# Altium footprint library Binh.PcbLib: 863 footprints (part 12 of 54)
Each footprint in its own frame and in the unit in brackets; x right, y up, seen from the top. Pads: shape width x height; smd on the part's side, far side on the other; paste and mask are expansions set on the pad; w line width, h text height; cw(c..) or ccw(c..) is an arc to the next point about the centre after c.
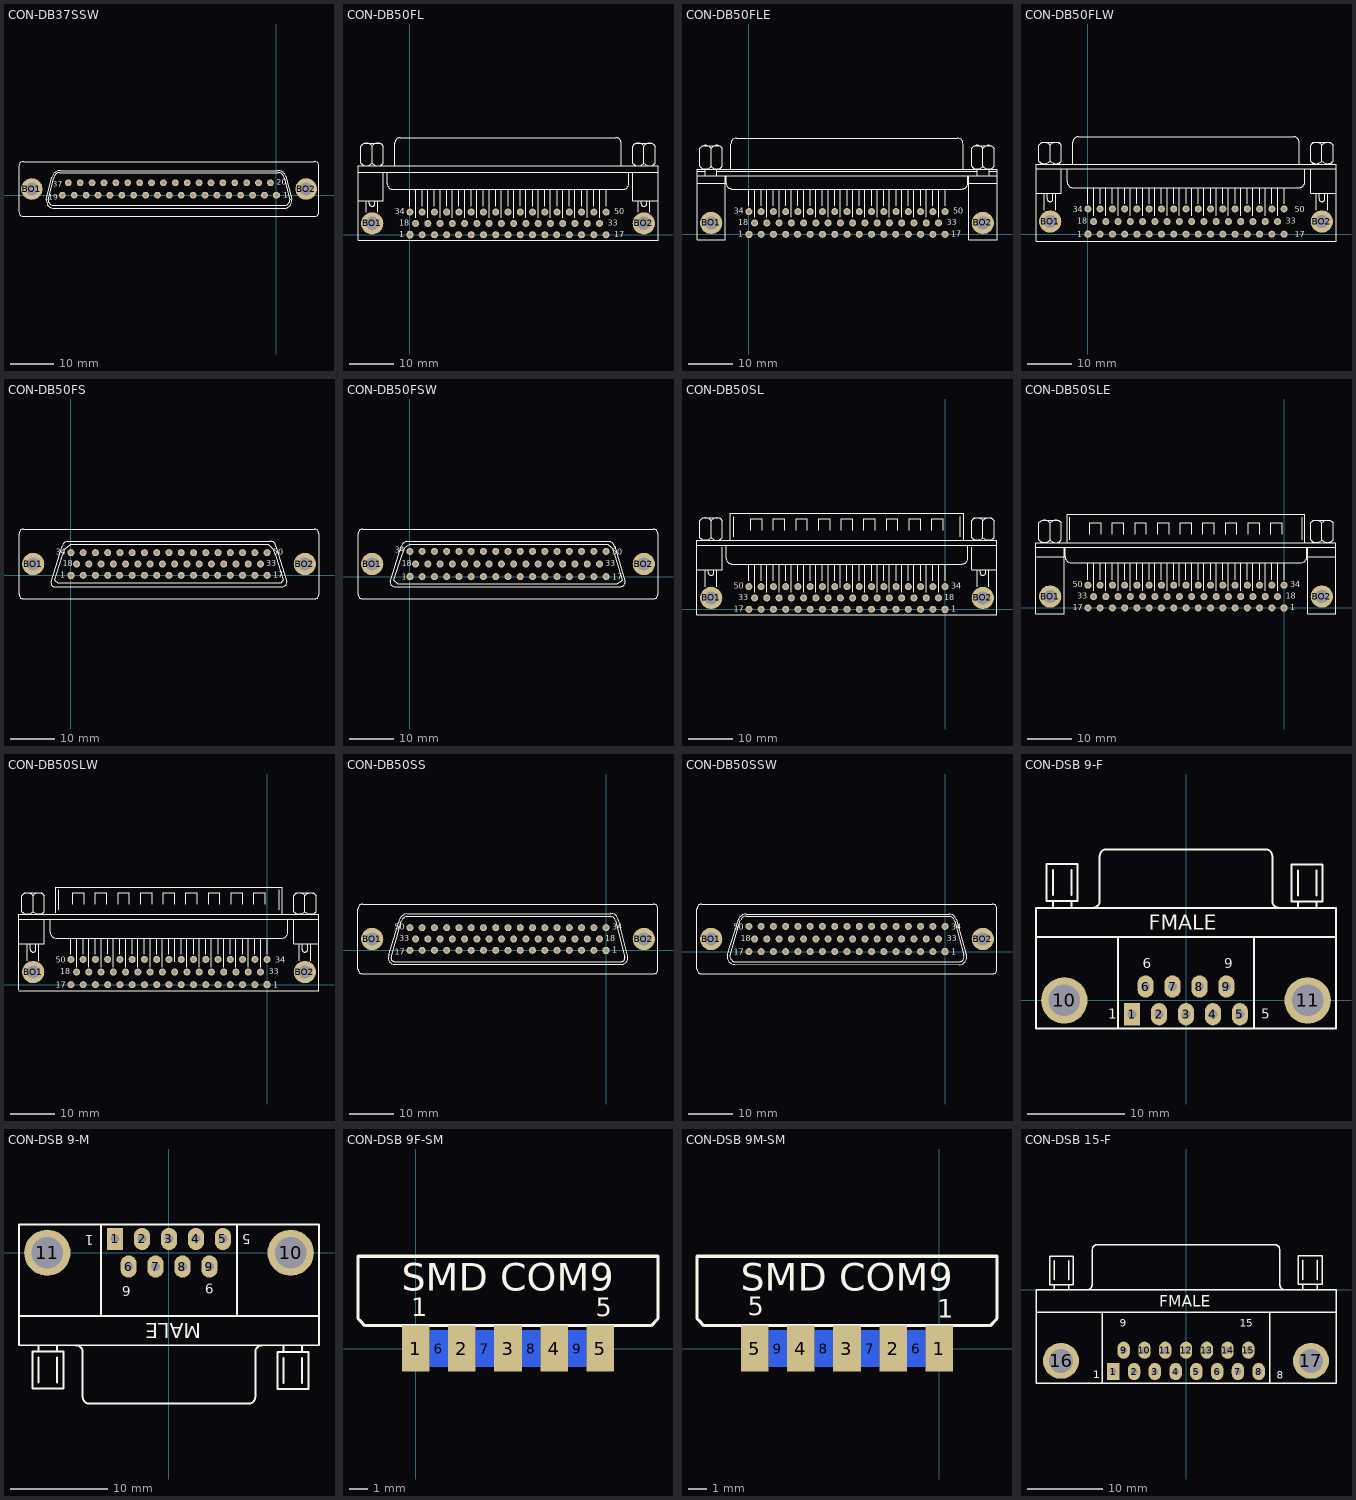
[diagram p11: the footprints below, top view; thin cyan lines are the x and y axes]

## CON-DB37SSW [mil]
pads (39):
  oct 62x62 hole 35: 1(0,0)
  round 62 hole 35: 2(-108.33,0) 3(-216.67,0) 4(-325,0) 5(-433.33,0) 6(-541.67,0) 7(-650,0) 8(-758.33,0) 9(-866.67,0) 10(-975,0) 11(-1083.33,0) 12(-1191.67,0) 13(-1300,0) 14(-1408.33,0) 15(-1516.67,0) 16(-1625,0) 17(-1733.33,0) 18(-1841.67,0) 19(-1950,0) 20(-54.17,113.33) 21(-162.5,113.33) 22(-270.83,113.33) 23(-379.17,113.33) 24(-487.5,113.33) 25(-595.83,113.33) 26(-704.17,113.33) 27(-812.5,113.33) 28(-920.83,113.33) 29(-1029.17,113.33) 30(-1137.5,113.33) 31(-1245.83,113.33) 32(-1354.17,113.33) 33(-1462.5,113.33) 34(-1570.83,113.33) 35(-1679.17,113.33) 36(-1787.5,113.33) 37(-1895.83,113.33)
  round 196.67 hole 118.33: BO1(-2228.33,56.67) BO2(271.67,56.67)
Top Overlay:
  lines w8: -2095,-43.33 -2045,165 ; -2094.5,-43.54 ccw(c-2028.33,-51.67) -2028.33,-118.33 80,-118.33 ; -2044.7,165.58 cw(c-1970,148.33) -1970,225 13.33,225 cw(c13.33,148.33) 86.25,172.02 ; -2028.59,156.57 cw(c-1970,148.33) -1978.23,206.92 ; -2028.33,156.67 -2078.33,-43.33 ccw(c-2028.33,-43.33) -2028.33,-93.33 71.67,-93.33 ccw(c71.67,-43.33) 121.67,-43.33 71.67,156.67 ; -1978.33,206.67 21.67,206.67 ; 21.57,206.92 cw(c13.33,148.33) 71.92,156.57 ; 79.89,-118.66 ccw(c71.67,-51.67) 137.16,-35.34 ; 85,171.67 138.33,-35 ; 387.57,-143.72 cw(c346.67,-151.67) 346.67,-193.33 -2303.33,-193.33 cw(c-2303.33,-151.67) -2345,-151.67 -2345,265 cw(c-2303.33,265) -2303.33,306.67 346.67,306.67 cw(c346.67,265) 388.33,265 388.33,-151.67
  text "20" at 1.67,96.67 h50
  text "1" at 61.67,-23.33 h50
  text "37" at -2038.33,76.67 h50
  text "19" at -2078.33,-43.33 h50

## CON-DB50FL [mil]
pads (52):
  oct 62x62 hole 35: 1(0,0)
  round 62 hole 35: 2(108.33,0) 3(216.67,0) 4(325,0) 5(430,0) 6(541.67,0) 7(650,0) 8(758.33,0) 9(866.67,0) 10(975,0) 11(1083.33,0) 12(1191.67,0) 13(1296.67,0) 14(1408.33,0) 15(1516.67,0) 16(1625,0) 17(1733.33,0) 18(50,100) 19(158.33,100) 20(266.67,100) 21(375,100) 22(483.33,100) 23(591.67,100) 24(700,100) 25(808.33,100) 26(916.67,100) 27(1025,100) 28(1133.33,100) 29(1241.67,100) 30(1350,100) 31(1458.33,100) 32(1566.67,100) 33(1675,100) 34(0,200) 35(108.33,200) 36(216.67,200) 37(325,200) 38(433.33,200) 39(541.67,200) 40(650,200) 41(758.33,200) 42(866.67,200) 43(975,200) 44(1083.33,200) 45(1191.67,200) 46(1300,200) 47(1408.33,200) 48(1516.67,200) 49(1625,200) 50(1733.33,200)
  round 196.67 hole 118.33: BO1(-333.33,100) BO2(2066.67,100)
Top Overlay:
  lines w8: -458.33,300 -233.33,300 -233.33,550 ; -458.33,550 2191.67,550 ; -433.13,633.22 ccw(c-383.33,675) -333.54,633.22 ; -433.08,783.55 cw(c-383.33,750) -333.59,783.55 ; -408.33,608.33 -433.33,633.33 -433.33,783.33 -408.33,808.33 -258.33,808.33 -233.33,783.33 -233.33,633.33 -258.33,608.33 ; -383.33,200 -383.33,300 ; -358.33,300 -358.33,275 ccw(c-333.33,275) -308.33,275 -308.33,300 ; -333.33,633.33 -333.33,783.33 ; -333.13,633.22 ccw(c-283.33,675) -233.54,633.22 ; -333.08,783.55 cw(c-283.33,750) -233.59,783.55 ; -283.33,200 -283.33,300 ; -200,541.67 -200,450 ccw(c-150,450) -150,400 1883.33,400 ccw(c1883.33,450) 1933.33,450 1933.33,541.67 ; -133.33,608.33 -133.33,808.33 cw(c-83.33,808.33) -83.33,858.33 1816.67,858.33 cw(c1816.67,808.33) 1866.67,808.33 1866.67,608.33 ; 0,250 0,400 ; 50,150 50,400 ; 108.33,250 108.33,400 ; 158.33,150 158.33,400 ; 216.67,250 216.67,400 ; 266.67,150 266.67,400 ; 325,250 325,400 ; 375,150 375,400 ; 433.33,250 433.33,400 ; 483.33,150 483.33,400 ; 541.67,250 541.67,400 ; 591.67,150 591.67,400 ; 650,250 650,400 ; 700,150 700,400 ; 758.33,250 758.33,400 ; 808.33,150 808.33,400 ; 866.67,250 866.67,400 ; 916.67,166.67 916.67,150 916.67,400 ; 975,250 975,400 ; 1025,150 1025,400 ; 1083.33,250 1083.33,400 ; 1133.33,150 1133.33,400 ; 1191.67,250 1191.67,400 ; 1241.67,150 1241.67,400 ; 1300,250 1300,400 ; 1350,150 1350,400 ; 1408.33,250 1408.33,400 ; 1458.33,150 1458.33,400 ; 1516.67,250 1516.67,400 ; 1566.67,150 1566.67,400 ; 1625,250 1625,400 ; 1675,150 1675,400 ; 1733.33,250 1733.33,400 ; 1966.67,550 1966.67,300 2191.67,300 ; 1966.87,633.22 ccw(c2016.67,675) 2066.46,633.22 ; 1966.92,783.55 cw(c2016.67,750) 2066.41,783.55 ; 1991.67,608.33 1966.67,633.33 1966.67,783.33 1991.67,808.33 2141.67,808.33 2166.67,783.33 2166.67,633.33 2141.67,608.33 ; 2016.67,200 2016.67,300 ; 2041.67,300 2041.67,275 ccw(c2066.67,275) 2091.67,275 2091.67,300 ; 2066.67,633.33 2066.67,783.33 ; 2066.87,633.22 ccw(c2116.67,675) 2166.46,633.22 ; 2066.92,783.55 cw(c2116.67,750) 2166.41,783.55 ; 2116.67,200 2116.67,300 ; -458.33,-50 2191.67,-50 2191.67,608.33 -458.33,608.33 -458.33,-50
  text "34" at -133.33,180 h50
  text "50" at 1806.67,180 h50
  text "33" at 1746.67,80 h50
  text "17" at 1806.67,-20 h50
  text "1" at -93.33,-20 h50
  text "18" at -93.33,80 h50

## CON-DB50FLE [mil]
pads (52):
  oct 62x62 hole 35: 1(0,0)
  round 62 hole 35: 2(108.33,0) 3(216.67,0) 4(325,0) 5(430,0) 6(541.67,0) 7(650,0) 8(758.33,0) 9(866.67,0) 10(975,0) 11(1083.33,0) 12(1191.67,0) 13(1296.67,0) 14(1408.33,0) 15(1516.67,0) 16(1625,0) 17(1733.33,0) 18(50,100) 19(158.33,100) 20(266.67,100) 21(375,100) 22(483.33,100) 23(591.67,100) 24(700,100) 25(808.33,100) 26(916.67,100) 27(1025,100) 28(1133.33,100) 29(1241.67,100) 30(1350,100) 31(1458.33,100) 32(1566.67,100) 33(1675,100) 34(0,200) 35(108.33,200) 36(216.67,200) 37(325,200) 38(433.33,200) 39(541.67,200) 40(650,200) 41(758.33,200) 42(866.67,200) 43(975,200) 44(1083.33,200) 45(1191.67,200) 46(1300,200) 47(1408.33,200) 48(1516.67,200) 49(1625,200) 50(1733.33,200)
  round 196.67 hole 118.33: BO1(-333.33,100) BO2(2066.67,100)
Top Overlay:
  lines w8: -458.33,450 -208.33,450 ; -458.33,516.67 2191.67,516.67 ; -458.33,558.33 -383.33,558.33 ; -433.13,599.88 ccw(c-383.33,641.67) -333.54,599.88 ; -433.08,758.55 cw(c-383.33,725) -333.59,758.55 ; -408.33,575 -433.33,600 -433.33,758.33 -408.33,783.33 -258.33,783.33 -233.33,758.33 -233.33,600 -258.33,575 ; -383.33,516.67 -383.33,575 ; -333.33,600 -333.33,758.33 ; -333.13,599.88 ccw(c-283.33,641.67) -233.54,599.88 ; -333.08,758.55 cw(c-283.33,725) -233.59,758.55 ; -283.33,516.67 -283.33,575 ; -283.33,558.33 2016.67,558.33 ; -208.33,516.67 -208.33,-50 -458.33,-50 -458.33,575 2191.67,575 2191.67,-50 1941.67,-50 1941.67,516.67 ; -200,516.67 -200,450 ccw(c-150,450) -150,400 1883.33,400 ccw(c1883.33,450) 1933.33,450 1933.33,516.67 ; -158.33,575 -158.33,800 cw(c-108.33,800) -108.33,850 1841.67,850 cw(c1841.67,800) 1891.67,800 1891.67,575 ; 0,250 0,400 ; 50,150 50,400 ; 108.33,250 108.33,400 ; 158.33,150 158.33,400 ; 216.67,250 216.67,400 ; 266.67,150 266.67,400 ; 325,250 325,400 ; 375,150 375,400 ; 433.33,250 433.33,400 ; 483.33,150 483.33,400 ; 541.67,250 541.67,400 ; 591.67,150 591.67,400 ; 650,250 650,400 ; 700,150 700,400 ; 758.33,250 758.33,400 ; 808.33,150 808.33,400 ; 866.67,250 866.67,400 ; 916.67,166.67 916.67,150 916.67,400 ; 975,250 975,400 ; 1025,150 1025,400 ; 1083.33,250 1083.33,400 ; 1133.33,150 1133.33,400 ; 1191.67,250 1191.67,400 ; 1241.67,150 1241.67,400 ; 1300,250 1300,400 ; 1350,150 1350,400 ; 1408.33,250 1408.33,400 ; 1458.33,150 1458.33,400 ; 1516.67,250 1516.67,400 ; 1566.67,150 1566.67,400 ; 1625,250 1625,400 ; 1675,150 1675,400 ; 1733.33,250 1733.33,400 ; 1941.67,450 2191.67,450 ; 1966.87,599.88 ccw(c2016.67,641.67) 2066.46,599.88 ; 1966.92,758.55 cw(c2016.67,725) 2066.41,758.55 ; 1991.67,575 1966.67,600 1966.67,758.33 1991.67,783.33 2141.67,783.33 2166.67,758.33 2166.67,600 2141.67,575 ; 2016.67,516.67 2016.67,575 ; 2066.67,600 2066.67,758.33 ; 2066.87,599.88 ccw(c2116.67,641.67) 2166.46,599.88 ; 2066.92,758.55 cw(c2116.67,725) 2166.41,758.55 ; 2125,516.67 2125,575 ; 2125,558.33 2191.67,558.33
  text "34" at -133.33,180 h50
  text "18" at -93.33,80 h50
  text "1" at -93.33,-20 h50
  text "17" at 1786.67,-20 h50
  text "33" at 1746.67,80 h50
  text "50" at 1806.67,180 h50

## CON-DB50FLW [mil]
pads (52):
  oct 62x62 hole 35: 1(0,0)
  round 62 hole 35: 2(108.33,0) 3(216.67,0) 4(325,0) 5(433.33,0) 6(541.67,0) 7(650,0) 8(758.33,0) 9(866.67,0) 10(975,0) 11(1083.33,0) 12(1191.67,0) 13(1300,0) 14(1408.33,0) 15(1516.67,0) 16(1625,0) 17(1733.33,0) 18(50,111.67) 19(158.33,111.67) 20(266.67,111.67) 21(375,111.67) 22(483.33,111.67) 23(591.67,111.67) 24(700,111.67) 25(808.33,111.67) 26(916.67,111.67) 27(1025,111.67) 28(1133.33,111.67) 29(1241.67,111.67) 30(1350,111.67) 31(1458.33,111.67) 32(1566.67,111.67) 33(1675,111.67) 34(0,223.33) 35(108.33,223.33) 36(216.67,223.33) 37(325,223.33) 38(433.33,223.33) 39(541.67,223.33) 40(650,223.33) 41(758.33,223.33) 42(866.67,223.33) 43(975,223.33) 44(1083.33,223.33) 45(1191.67,223.33) 46(1300,223.33) 47(1408.33,223.33) 48(1516.67,223.33) 49(1625,223.33) 50(1733.33,223.33)
  round 196.67 hole 118.33: BO1(-333.33,111.67) BO2(2066.67,111.67)
Top Overlay:
  lines w8: -458.33,361.67 -233.33,361.67 -233.33,578.33 ; -458.33,578.33 2191.67,578.33 ; -433.42,644.91 ccw(c-383.33,695) -333.25,644.91 ; -433.42,786.75 cw(c-383.33,736.67) -333.25,786.75 ; -408.33,620 -433.33,645 -433.33,786.67 -408.33,811.67 -258.33,811.67 -233.33,786.67 -233.33,778.33 -233.33,645 -258.33,620 ; -383.33,211.67 -383.33,361.67 ; -358.33,361.67 -358.33,311.67 ccw(c-333.33,311.67) -308.33,311.67 -308.33,361.67 ; -333.42,644.91 ccw(c-283.33,695) -233.25,644.91 ; -333.42,786.75 cw(c-283.33,736.67) -233.25,786.75 ; -333.33,645 -333.33,786.67 ; -283.33,211.67 -283.33,236.67 -283.33,361.67 ; -183.33,578.33 -183.33,461.67 ccw(c-133.33,461.67) -133.33,411.67 1866.67,411.67 ccw(c1866.67,461.67) 1916.67,461.67 1916.67,578.33 ; -133.33,620 -133.33,811.67 cw(c-83.33,811.67) -83.33,861.67 1816.67,861.67 cw(c1816.67,811.67) 1866.67,811.67 1866.67,620 ; 0,270 0,411.67 ; 50,161.67 50,411.67 ; 108.33,270 108.33,411.67 ; 158.33,161.67 158.33,411.67 ; 216.67,270 216.67,411.67 ; 266.67,161.67 266.67,411.67 ; 325,270 325,411.67 ; 375,161.67 375,411.67 ; 433.33,270 433.33,411.67 ; 483.33,161.67 483.33,411.67 ; 541.67,270 541.67,411.67 ; 591.67,161.67 591.67,411.67 ; 650,270 650,411.67 ; 700,161.67 700,411.67 ; 758.33,270 758.33,411.67 ; 808.33,161.67 808.33,411.67 ; 866.67,270 866.67,411.67 ; 916.67,161.67 916.67,411.67 ; 975,270 975,411.67 ; 1025,161.67 1025,411.67 ; 1083.33,270 1083.33,411.67 ; 1133.33,161.67 1133.33,411.67 ; 1191.67,270 1191.67,411.67 ; 1241.67,161.67 1241.67,411.67 ; 1300,270 1300,411.67 ; 1350,161.67 1350,411.67 ; 1408.33,270 1408.33,411.67 ; 1458.33,161.67 1458.33,411.67 ; 1516.67,270 1516.67,411.67 ; 1566.67,161.67 1566.67,411.67 ; 1625,270 1625,411.67 ; 1675,161.67 1675,411.67 ; 1733.33,270 1733.33,411.67 ; 1966.58,644.91 ccw(c2016.67,695) 2066.75,644.91 ; 1966.58,786.75 cw(c2016.67,736.67) 2066.75,786.75 ; 1966.67,578.33 1966.67,361.67 2191.67,361.67 ; 1991.67,620 1966.67,645 1966.67,786.67 1991.67,811.67 2141.67,811.67 2166.67,786.67 2166.67,778.33 2166.67,645 2141.67,620 ; 2016.67,211.67 2016.67,361.67 ; 2041.67,361.67 2041.67,311.67 ccw(c2066.67,311.67) 2091.67,311.67 2091.67,361.67 ; 2066.58,644.91 ccw(c2116.67,695) 2166.75,644.91 ; 2066.58,786.75 cw(c2116.67,736.67) 2166.75,786.75 ; 2066.67,645 2066.67,786.67 ; 2116.67,211.67 2116.67,361.67 ; -458.33,-63.33 -458.33,620 2191.67,620 2191.67,-63.33 -458.33,-63.33
  text "50" at 1826.67,191.67 h50
  text "33" at 1746.67,91.67 h50
  text "17" at 1826.67,-28.33 h50
  text "1" at -93.33,-28.33 h50
  text "18" at -93.33,91.67 h50
  text "34" at -133.33,191.67 h50

## CON-DB50FS [mil]
pads (52):
  oct 62x62 hole 35: 1(0,0)
  round 62 hole 35: 2(108.33,0) 3(216.67,0) 4(325,0) 5(430,0) 6(541.67,0) 7(650,0) 8(758.33,0) 9(866.67,0) 10(975,0) 11(1083.33,0) 12(1191.67,0) 13(1296.67,0) 14(1408.33,0) 15(1516.67,0) 16(1625,0) 17(1733.33,0) 18(50,100) 19(158.33,100) 20(266.67,100) 21(375,100) 22(483.33,100) 23(591.67,100) 24(700,100) 25(808.33,100) 26(916.67,100) 27(1025,100) 28(1133.33,100) 29(1241.67,100) 30(1350,100) 31(1458.33,100) 32(1566.67,100) 33(1675,100) 34(0,200) 35(108.33,200) 36(216.67,200) 37(325,200) 38(433.33,200) 39(541.67,200) 40(650,200) 41(758.33,200) 42(866.67,200) 43(975,200) 44(1083.33,200) 45(1191.67,200) 46(1300,200) 47(1408.33,200) 48(1516.67,200) 49(1625,200) 50(1733.33,200)
  round 196.67 hole 118.33: BO1(-333.33,100) BO2(2066.67,100)
Top Overlay:
  lines w8: -175,-58.33 -75,258.33 ; -174.82,-58.4 ccw(c-141.67,-66.67) -133.4,-99.82 ; -133.33,-100 1866.67,-100 ccw(c1866.67,-58.33) 1908.33,-58.33 1808.33,258.33 ccw(c1766.67,258.33) 1766.67,300 -33.33,300 ; -75.21,257.95 cw(c-25,250) -32.95,300.21 ; -458.33,-166.67 ccw(c-416.67,-166.67) -416.67,-208.33 2150,-208.33 ccw(c2150,-166.67) 2191.66,-166.67 2191.67,366.67 ccw(c2150,366.67) 2150,408.33 -416.67,408.33 ccw(c-416.67,366.67) -458.33,366.67 -458.33,-166.67 ; -141.67,-41.67 -116.67,-66.67 1858.33,-66.67 1875,-41.67 1808.33,166.67 1783.33,233.33 1741.67,275 0,275 -50,233.33 -75,166.67 -141.67,-41.67
  text "34" at -133.33,180 h50
  text "18" at -73.33,80 h50
  text "1" at -93.33,-20 h50
  text "17" at 1786.67,-20 h50
  text "33" at 1726.67,80 h50
  text "50" at 1786.67,180 h50

## CON-DB50FSW [mil]
pads (52):
  oct 62x62 hole 35: 1(0,0)
  round 62 hole 35: 2(108.33,0) 3(216.67,0) 4(325,0) 5(433.33,0) 6(541.67,0) 7(650,0) 8(758.33,0) 9(866.67,0) 10(975,0) 11(1083.33,0) 12(1191.67,0) 13(1300,0) 14(1408.33,0) 15(1516.67,0) 16(1625,0) 17(1733.33,0) 18(50,111.67) 19(158.33,111.67) 20(266.67,111.67) 21(375,111.67) 22(483.33,111.67) 23(591.67,111.67) 24(700,111.67) 25(808.33,111.67) 26(916.67,111.67) 27(1025,111.67) 28(1133.33,111.67) 29(1241.67,111.67) 30(1350,111.67) 31(1458.33,111.67) 32(1566.67,111.67) 33(1675,111.67) 34(0,223.33) 35(108.33,223.33) 36(216.67,223.33) 37(325,223.33) 38(433.33,223.33) 39(541.67,223.33) 40(650,223.33) 41(758.33,223.33) 42(866.67,223.33) 43(975,223.33) 44(1083.33,223.33) 45(1191.67,223.33) 46(1300,223.33) 47(1408.33,223.33) 48(1516.67,223.33) 49(1625,223.33) 50(1733.33,223.33)
  round 196.67 hole 118.33: BO1(-333.33,111.67) BO2(2066.67,111.67)
Top Overlay:
  lines w8: -75.14,270.1 cw(c-16.67,253.33) -33.43,311.81 ; -75,270 -175,-46.67 ccw(c-133.33,-46.67) -133.33,-88.33 1866.67,-88.33 ; -33.33,311.67 1766.67,311.67 ; 1766.31,310.21 cw(c1750,253.33) 1808.59,261.57 ; 1808.33,270 1900,-38.33 ; 1866.44,-88.39 ccw(c1858.33,-46.67) 1900.05,-38.56 ; -458.33,-155 ccw(c-416.67,-155) -416.67,-196.67 2150,-196.67 ccw(c2150,-155) 2191.66,-155 2191.67,378.33 ccw(c2150,378.33) 2150,420 -416.67,420 ccw(c-416.67,378.33) -458.33,378.33 -458.33,-155 ; -141.67,-30 -66.67,195 -41.67,261.67 0,286.67 1733.33,286.67 1750,286.67 1783.33,253.33 1808.33,186.67 1875,-30 1833.33,-63.33 -108.33,-63.33 -141.67,-30
  text "50" at 1786.67,191.67 h50
  text "33" at 1726.67,91.67 h50
  text "17" at 1786.67,-28.33 h50
  text "34" at -133.33,211.67 h50
  text "18" at -73.33,91.67 h50
  text "1" at -73.33,-28.33 h50

## CON-DB50SL [mil]
pads (52):
  oct 62x62 hole 35: 1(0,0)
  round 62 hole 35: 2(-108.33,0) 3(-216.67,0) 4(-325,0) 5(-433.33,0) 6(-541.67,0) 7(-650,0) 8(-758.33,0) 9(-866.67,0) 10(-975,0) 11(-1083.33,0) 12(-1191.67,0) 13(-1300,0) 14(-1408.33,0) 15(-1516.67,0) 16(-1625,0) 17(-1733.33,0) 18(-58.33,100) 19(-166.67,100) 20(-275,100) 21(-383.33,100) 22(-491.67,100) 23(-600,100) 24(-708.33,100) 25(-816.67,100) 26(-925,100) 27(-1033.33,100) 28(-1141.67,100) 29(-1250,100) 30(-1358.33,100) 31(-1466.67,100) 32(-1575,100) 33(-1683.33,100) 34(0,200) 35(-108.33,200) 36(-216.67,200) 37(-325,200) 38(-433.33,200) 39(-541.67,200) 40(-650,200) 41(-758.33,200) 42(-866.67,200) 43(-975,200) 44(-1083.33,200) 45(-1191.67,200) 46(-1300,200) 47(-1408.33,200) 48(-1516.67,200) 49(-1625,200) 50(-1733.33,200)
  round 196.67 hole 118.33: BO1(-2066.67,100) BO2(333.33,100)
Top Overlay:
  lines w8: -2191.67,350 -1966.67,350 -1966.67,550 ; -2191.67,566.67 458.33,566.67 ; -2166.75,633.25 ccw(c-2116.67,683.33) -2066.58,633.25 ; -2166.46,783.45 cw(c-2116.67,741.67) -2066.87,783.45 ; -2141.67,608.33 -2166.67,633.33 -2166.67,783.33 -2141.67,808.33 -1991.67,808.33 -1966.67,783.33 -1966.67,633.33 -1991.67,608.33 ; -2116.67,200 -2116.67,350 ; -2091.67,350 -2091.67,325 ccw(c-2066.67,325) -2041.67,325 -2041.67,350 ; -2066.67,633.33 -2066.67,783.33 ; -2066.46,633.22 ccw(c-2016.67,675) -1966.87,633.22 ; -2066.46,783.45 cw(c-2016.67,741.67) -1966.87,783.45 ; -2016.67,200 -2016.67,350 ; -1933.33,566.67 -1933.33,450 ccw(c-1883.33,450) -1883.33,400 150,400 ccw(c150,450) 200,450 200,566.67 ; -1900,608.33 -1900,850 166.67,850 166.67,608.33 ; -1866.67,641.67 -1866.67,816.67 ; -1733.33,250 -1733.33,400 ; -1716.67,700 -1716.67,800 -1616.67,800 -1616.67,700 ; -1683.33,150 -1683.33,400 ; -1625,250 -1625,400 ; -1575,150 -1575,400 ; -1516.67,250 -1516.67,400 ; -1516.67,700 -1516.67,800 -1416.67,800 -1416.67,700 ; -1466.67,150 -1466.67,400 ; -1408.33,250 -1408.33,400 ; -1358.33,150 -1358.33,400 ; -1316.67,700 -1316.67,800 -1216.67,800 -1216.67,700 ; -1300,250 -1300,400 ; -1250,150 -1250,400 ; -1191.67,250 -1191.67,400 ; -1141.67,150 -1141.67,400 ; -1116.67,700 -1116.67,800 -1016.67,800 -1016.67,700 ; -1083.33,250 -1083.33,400 ; -1033.33,150 -1033.33,400 ; -975,250 -975,400 ; -925,191.67 -925,400 ; -916.67,700 -916.67,800 -816.67,800 -816.67,700 ; -866.67,250 -866.67,400 ; -816.67,150 -816.67,400 ; -758.33,250 -758.33,400 ; -716.67,700 -716.67,800 -616.67,800 -616.67,700 ; -708.33,150 -708.33,400 ; -650,250 -650,400 ; -600,150 -600,400 ; -541.67,250 -541.67,400 ; -516.67,700 -516.67,800 -416.67,800 -416.67,700 ; -491.67,150 -491.67,400 ; -433.33,250 -433.33,400 ; -383.33,150 -383.33,400 ; -325,250 -325,400 ; -316.67,700 -316.67,800 -216.67,800 -216.67,700 ; -275,150 -275,400 ; -216.67,250 -216.67,400 ; -166.67,150 -166.67,400 ; -116.67,700 -116.67,800 -16.67,800 -16.67,700 ; -108.33,250 -108.33,400 ; -58.33,150 -58.33,400 ; 0,250 0,400 ; 133.33,641.67 133.33,816.67 ; 233.25,633.25 ccw(c283.33,683.33) 333.42,633.25 ; 233.25,783.42 cw(c283.33,733.33) 333.42,783.42 ; 233.33,550 233.33,350 458.33,350 ; 258.33,608.33 250,616.67 233.33,633.33 233.33,783.33 258.33,808.33 408.33,808.33 433.33,783.33 433.33,633.33 408.33,608.33 ; 283.33,200 283.33,350 ; 308.33,350 308.33,325 ccw(c333.33,325) 358.33,325 358.33,350 ; 333.25,633.25 ccw(c383.33,683.33) 433.42,633.25 ; 333.25,783.42 cw(c383.33,733.33) 433.42,783.42 ; 333.33,633.33 333.33,783.33 ; 383.33,200 383.33,350 ; -2191.67,-50 -2191.67,608.33 458.33,608.33 458.33,-50 -2191.67,-50
  text "50" at -1866.67,180 h50
  text "33" at -1826.67,80 h50
  text "17" at -1866.67,-20 h50
  text "1" at 53.33,-20 h50
  text "18" at -6.67,80 h50
  text "34" at 53.33,180 h50

## CON-DB50SLE [mil]
pads (52):
  oct 62x62 hole 35: 1(0,0)
  round 62 hole 35: 2(-108.33,0) 3(-216.67,0) 4(-325,0) 5(-433.33,0) 6(-541.67,0) 7(-650,0) 8(-758.33,0) 9(-866.67,0) 10(-975,0) 11(-1083.33,0) 12(-1191.67,0) 13(-1300,0) 14(-1408.33,0) 15(-1516.67,0) 16(-1625,0) 17(-1733.33,0) 18(-58.33,100) 19(-166.67,100) 20(-275,100) 21(-383.33,100) 22(-491.67,100) 23(-600,100) 24(-708.33,100) 25(-816.67,100) 26(-925,100) 27(-1033.33,100) 28(-1141.67,100) 29(-1250,100) 30(-1358.33,100) 31(-1466.67,100) 32(-1575,100) 33(-1683.33,100) 34(0,200) 35(-108.33,200) 36(-216.67,200) 37(-325,200) 38(-433.33,200) 39(-541.67,200) 40(-650,200) 41(-758.33,200) 42(-866.67,200) 43(-975,200) 44(-1083.33,200) 45(-1191.67,200) 46(-1300,200) 47(-1408.33,200) 48(-1516.67,200) 49(-1625,200) 50(-1733.33,200)
  round 196.67 hole 118.33: BO1(-2066.67,100) BO2(333.33,100)
Top Overlay:
  lines w8: -2191.67,450 -1941.67,450 ; -2191.67,533.33 458.33,533.33 ; -2166.75,599.91 ccw(c-2116.67,650) -2066.58,599.91 ; -2166.46,750.11 cw(c-2116.67,708.33) -2066.87,750.11 ; -2141.67,575 -2166.67,600 -2166.67,750 -2141.67,775 -1991.67,775 -1966.67,750 -1966.67,600 -1991.67,575 ; -2066.67,600 -2066.67,750 ; -2066.46,599.88 ccw(c-2016.67,641.67) -1966.87,599.88 ; -2066.46,750.11 cw(c-2016.67,708.33) -1966.87,750.11 ; -1941.67,533.33 -1941.67,-50 -2191.67,-50 -2191.67,575 458.33,575 458.33,-50 208.33,-50 208.33,533.33 ; -1933.33,533.33 -1933.33,450 ccw(c-1883.33,450) -1883.33,400 150,400 ccw(c150,450) 200,450 200,533.33 ; -1916.67,575 -1916.67,825 183.33,825 183.33,575 ; -1891.67,600 -1891.67,800 ; -1733.33,250 -1733.33,400 ; -1716.67,650 -1716.67,750 -1616.67,750 -1616.67,650 ; -1683.33,150 -1683.33,400 ; -1625,250 -1625,400 ; -1575,150 -1575,400 ; -1516.67,250 -1516.67,400 ; -1516.67,650 -1516.67,750 -1416.67,750 -1416.67,650 ; -1466.67,150 -1466.67,400 ; -1408.33,250 -1408.33,400 ; -1358.33,150 -1358.33,400 ; -1316.67,650 -1316.67,750 -1216.67,750 -1216.67,650 ; -1300,250 -1300,400 ; -1250,150 -1250,400 ; -1191.67,250 -1191.67,400 ; -1141.67,150 -1141.67,400 ; -1116.67,650 -1116.67,750 -1016.67,750 -1016.67,650 ; -1083.33,250 -1083.33,400 ; -1033.33,150 -1033.33,400 ; -975,250 -975,400 ; -925,191.67 -925,400 ; -916.67,650 -916.67,750 -816.67,750 -816.67,650 ; -866.67,250 -866.67,400 ; -816.67,150 -816.67,400 ; -758.33,250 -758.33,400 ; -716.67,650 -716.67,750 -616.67,750 -616.67,650 ; -708.33,150 -708.33,400 ; -650,250 -650,400 ; -600,150 -600,400 ; -541.67,250 -541.67,400 ; -516.67,650 -516.67,750 -416.67,750 -416.67,650 ; -491.67,150 -491.67,400 ; -433.33,250 -433.33,400 ; -383.33,150 -383.33,400 ; -325,250 -325,400 ; -316.67,650 -316.67,750 -216.67,750 -216.67,650 ; -275,150 -275,400 ; -216.67,250 -216.67,400 ; -166.67,150 -166.67,400 ; -116.67,650 -116.67,750 -16.67,750 -16.67,650 ; -108.33,250 -108.33,400 ; -58.33,150 -58.33,400 ; 0,250 0,400 ; 158.33,600 158.33,800 ; 208.33,450 458.33,450 ; 233.25,599.91 ccw(c283.33,650) 333.42,599.91 ; 233.25,750.09 cw(c283.33,700) 333.42,750.09 ; 258.33,575 233.33,600 233.33,750 258.33,775 408.33,775 433.33,750 433.33,600 408.33,575 ; 333.25,599.91 ccw(c383.33,650) 433.42,599.91 ; 333.25,750.09 cw(c383.33,700) 433.42,750.09 ; 333.33,600 333.33,750
  text "34" at 53.33,180 h50
  text "18" at 13.33,80 h50
  text "1" at 53.33,-20 h50
  text "17" at -1866.67,-20 h50
  text "33" at -1826.67,80 h50
  text "50" at -1866.67,180 h50

## CON-DB50SLW [mil]
pads (52):
  oct 62x62 hole 35: 1(0,0)
  round 62 hole 35: 2(-108.33,0) 3(-216.67,0) 4(-325,0) 5(-433.33,0) 6(-541.67,0) 7(-650,0) 8(-758.33,0) 9(-866.67,0) 10(-975,0) 11(-1083.33,0) 12(-1191.67,0) 13(-1300,0) 14(-1408.33,0) 15(-1516.67,0) 16(-1625,0) 17(-1733.33,0) 18(-1683.33,111.67) 19(-1575,111.67) 20(-1466.67,111.67) 21(-1358.33,111.67) 22(-1250,111.67) 23(-1141.67,111.67) 24(-1033.33,111.67) 25(-925,111.67) 26(-816.67,111.67) 27(-708.33,111.67) 28(-600,111.67) 29(-491.67,111.67) 30(-383.33,111.67) 31(-275,111.67) 32(-166.67,111.67) 33(-58.33,111.67) 34(0,223.33) 35(-108.33,223.33) 36(-216.67,223.33) 37(-325,223.33) 38(-433.33,223.33) 39(-541.67,223.33) 40(-650,223.33) 41(-758.33,223.33) 42(-866.67,223.33) 43(-975,223.33) 44(-1083.33,223.33) 45(-1191.67,223.33) 46(-1300,223.33) 47(-1408.33,223.33) 48(-1516.67,223.33) 49(-1625,223.33) 50(-1733.33,223.33)
  round 196.67 hole 118.33: BO1(-2066.67,111.67) BO2(333.33,111.67)
Top Overlay:
  lines w8: -2191.67,-55 458.33,-55 458.33,620 -2191.67,620 -2191.67,-46.67 ; -2191.67,361.67 -1966.67,361.67 -1966.67,578.33 ; -2191.67,578.33 458.33,578.33 ; -2166.75,644.91 ccw(c-2116.67,695) -2066.58,644.91 ; -2166.75,786.75 cw(c-2116.67,736.67) -2066.58,786.75 ; -2141.67,620 -2166.67,645 -2166.67,786.67 -2141.67,811.67 -1991.67,811.67 -1966.67,786.67 -1966.67,778.33 -1966.67,645 -1991.67,620 ; -2116.67,211.67 -2116.67,361.67 ; -2091.67,361.67 -2091.67,311.67 ccw(c-2066.67,311.67) -2041.67,311.67 -2041.67,361.67 ; -2066.75,644.91 ccw(c-2016.67,695) -1966.58,644.91 ; -2066.75,786.75 cw(c-2016.67,736.67) -1966.58,786.75 ; -2066.67,645 -2066.67,786.67 ; -2016.67,211.67 -2016.67,361.67 ; -1916.67,578.33 -1916.67,461.67 ccw(c-1866.67,461.67) -1866.67,411.67 133.33,411.67 ccw(c133.33,461.67) 183.33,461.67 183.33,578.33 ; -1866.67,636.67 -1866.67,861.67 133.33,861.67 133.33,620 ; -1841.67,661.67 -1841.67,836.67 ; -1733.33,270 -1733.33,411.67 ; -1716.67,711.67 -1716.67,811.67 -1616.67,811.67 -1616.67,711.67 ; -1683.33,153.33 -1683.33,411.67 ; -1625,270 -1625,411.67 ; -1575,153.33 -1575,411.67 ; -1516.67,270 -1516.67,411.67 ; -1516.67,711.67 -1516.67,811.67 -1416.67,811.67 -1416.67,711.67 ; -1466.67,153.33 -1466.67,411.67 ; -1408.33,270 -1408.33,411.67 ; -1358.33,153.33 -1358.33,411.67 ; -1316.67,711.67 -1316.67,811.67 -1216.67,811.67 -1216.67,711.67 ; -1300,270 -1300,411.67 ; -1250,153.33 -1250,411.67 ; -1191.67,270 -1191.67,411.67 ; -1141.67,153.33 -1141.67,411.67 ; -1116.67,711.67 -1116.67,811.67 -1016.67,811.67 -1016.67,711.67 ; -1083.33,270 -1083.33,411.67 ; -1033.33,153.33 -1033.33,411.67 ; -975,270 -975,411.67 ; -925,153.33 -925,411.67 ; -916.67,711.67 -916.67,811.67 -816.67,811.67 -816.67,711.67 ; -866.67,270 -866.67,411.67 ; -816.67,203.33 -816.67,411.67 ; -758.33,270 -758.33,411.67 ; -716.67,711.67 -716.67,811.67 -616.67,811.67 -616.67,711.67 ; -708.33,153.33 -708.33,411.67 ; -650,270 -650,411.67 ; -600,153.33 -600,411.67 ; -541.67,270 -541.67,411.67 ; -516.67,711.67 -516.67,811.67 -416.67,811.67 -416.67,711.67 ; -491.67,153.33 -491.67,411.67 ; -433.33,270 -433.33,411.67 ; -383.33,153.33 -383.33,411.67 ; -325,270 -325,411.67 ; -316.67,711.67 -316.67,811.67 -216.67,811.67 -216.67,711.67 ; -275,153.33 -275,411.67 ; -216.67,270 -216.67,411.67 ; -166.67,153.33 -166.67,411.67 ; -116.67,711.67 -116.67,811.67 -16.67,811.67 -16.67,711.67 ; -108.33,270 -108.33,411.67 ; -58.33,153.33 -58.33,411.67 ; 0,270 0,411.67 ; 108.33,661.67 108.33,836.67 ; 233.25,644.91 ccw(c283.33,695) 333.42,644.91 ; 233.25,786.75 cw(c283.33,736.67) 333.42,786.75 ; 233.33,578.33 233.33,361.67 458.33,361.67 ; 258.33,620 233.33,645 233.33,786.67 258.33,811.67 408.33,811.67 433.33,786.67 433.33,778.33 433.33,645 408.33,620 ; 283.33,211.67 283.33,361.67 ; 308.33,361.67 308.33,311.67 ccw(c333.33,311.67) 358.33,311.67 358.33,361.67 ; 333.25,644.91 ccw(c383.33,695) 433.42,644.91 ; 333.25,786.75 cw(c383.33,736.67) 433.42,786.75 ; 333.33,645 333.33,786.67 ; 383.33,211.67 383.33,361.67
  text "50" at -1866.67,191.67 h50
  text "18" at -1826.67,91.67 h50
  text "17" at -1866.67,-28.33 h50
  text "1" at 53.33,-28.33 h50
  text "33" at 13.33,91.67 h50
  text "34" at 73.33,191.67 h50

## CON-DB50SS [mil]
pads (52):
  oct 62x62 hole 35: 1(0,0)
  round 62 hole 35: 2(-108.33,0) 3(-216.67,0) 4(-325,0) 5(-433.33,0) 6(-541.67,0) 7(-650,0) 8(-758.33,0) 9(-866.67,0) 10(-975,0) 11(-1083.33,0) 12(-1191.67,0) 13(-1300,0) 14(-1408.33,0) 15(-1516.67,0) 16(-1625,0) 17(-1733.33,0) 18(-58.33,100) 19(-166.67,100) 20(-275,100) 21(-383.33,100) 22(-491.67,100) 23(-600,100) 24(-708.33,100) 25(-816.67,100) 26(-925,100) 27(-1033.33,100) 28(-1141.67,100) 29(-1250,100) 30(-1358.33,100) 31(-1466.67,100) 32(-1575,100) 33(-1683.33,100) 34(0,200) 35(-108.33,200) 36(-216.67,200) 37(-325,200) 38(-433.33,200) 39(-541.67,200) 40(-650,200) 41(-758.33,200) 42(-866.67,200) 43(-975,200) 44(-1083.33,200) 45(-1191.67,200) 46(-1300,200) 47(-1408.33,200) 48(-1516.67,200) 49(-1625,200) 50(-1733.33,200)
  round 196.67 hole 118.33: BO1(-2066.67,100) BO2(333.33,100)
Top Overlay:
  lines w8: -1920,-41.67 -1833.33,250 ; -1918.64,-40.18 ccw(c-1866.67,-66.67) -1866.67,-125 133.33,-125 ccw(c133.33,-66.67) 189.41,-50.59 ; -1833.58,249.54 cw(c-1741.67,233.33) -1765.82,323.49 ; -1808.33,258.33 -1900,-66.67 ccw(c-1866.67,-66.67) -1866.67,-100 133.33,-100 ccw(c133.33,-66.67) 165.04,-56.37 ; -1807.79,258.72 cw(c-1741.67,233.33) -1767.05,299.46 ; -1766.67,300 41.67,300 ; -1758.33,325 41.67,325 ; 41.29,300.21 cw(c33.33,250) 83.54,257.95 ; 41.67,325.83 cw(c41.67,258.33) 108.66,266.56 ; 83.33,258.33 166.67,-66.67 ; 108.33,266.67 188.33,-51.67 ; -2191.66,-166.67 ccw(c-2150,-166.67) -2150,-208.33 416.67,-208.33 ccw(c416.67,-166.67) 458.33,-166.67 458.33,366.67 ccw(c416.67,366.67) 416.67,408.33 -2150,408.33 ccw(c-2150,366.67) -2191.66,366.67 -2191.67,-166.67
  text "34" at 53.33,180 h50
  text "18" at -6.67,80 h50
  text "1" at 53.33,-20 h50
  text "17" at -1866.67,-40 h50
  text "33" at -1826.67,80 h50
  text "50" at -1866.67,180 h50

## CON-DB50SSW [mil]
pads (52):
  oct 62x62 hole 35: 1(0,0)
  round 62 hole 35: 2(-108.33,0) 3(-216.67,0) 4(-325,0) 5(-433.33,0) 6(-541.67,0) 7(-650,0) 8(-758.33,0) 9(-866.67,0) 10(-975,0) 11(-1083.33,0) 12(-1191.67,0) 13(-1300,0) 14(-1408.33,0) 15(-1516.67,0) 16(-1625,0) 17(-1733.33,0) 18(-1683.33,111.67) 19(-1575,111.67) 20(-1466.67,111.67) 21(-1358.33,111.67) 22(-1250,111.67) 23(-1141.67,111.67) 24(-1033.33,111.67) 25(-925,111.67) 26(-816.67,111.67) 27(-708.33,111.67) 28(-600,111.67) 29(-491.67,111.67) 30(-383.33,111.67) 31(-275,111.67) 32(-166.67,111.67) 33(-58.33,111.67) 34(0,223.33) 35(-108.33,223.33) 36(-216.67,223.33) 37(-325,223.33) 38(-433.33,223.33) 39(-541.67,223.33) 40(-650,223.33) 41(-758.33,223.33) 42(-866.67,223.33) 43(-975,223.33) 44(-1083.33,223.33) 45(-1191.67,223.33) 46(-1300,223.33) 47(-1408.33,223.33) 48(-1516.67,223.33) 49(-1625,223.33) 50(-1733.33,223.33)
  round 196.67 hole 118.33: BO1(-2066.67,111.67) BO2(333.33,111.67)
Top Overlay:
  lines w8: -1923.33,-31.67 -1825,286.67 ; -1923.02,-30.54 ccw(c-1858.33,-46.67) -1858.33,-113.33 125,-115 ; -1900.21,-30.38 ccw(c-1850,-38.33) -1859.7,-88.23 ; -1900,-30 -1808.33,278.33 ; -1866.67,-88.33 133.33,-88.33 ; -1824.46,287.05 cw(c-1758.33,261.67) -1758.33,332.5 ; -1804.69,280.4 cw(c-1758.33,261.67) -1758.33,311.67 41.67,311.67 ; -1758.33,331.67 33.33,331.67 ; 33.33,332.5 cw(c33.33,261.67) 99.46,287.05 ; 40.41,312 cw(c33.33,261.67) 83.54,269.62 ; 83.33,270 166.67,-30 ; 100,286.67 183.33,-13.33 ; 125,-114.17 ccw(c125,-46.67) 183.46,-12.92 ; 133.11,-88.39 ccw(c125,-46.67) 164.41,-30.75 ; -2191.66,-155 ccw(c-2150,-155) -2150,-196.67 416.67,-196.67 ccw(c416.67,-155) 458.33,-155 458.33,378.33 ccw(c416.67,378.33) 416.67,420 -2150,420 ccw(c-2150,378.33) -2191.66,378.33 -2191.67,-155
  text "17" at -1866.67,-28.33 h50
  text "50" at -1866.67,191.67 h50
  text "18" at -1806.67,91.67 h50
  text "1" at 53.33,-28.33 h50
  text "33" at 13.33,91.67 h50
  text "34" at 53.33,191.67 h50

## CON-DSB 9-F [mil] "COM FMALE - D Subminiature; 9 Position; Right Angle; Pitch 1.385 mm"
height 501.97
pads (11):
  rect 65x90 hole 35: 1(-218.11,-55.91)
  oval 65x90 hole 35: 2(-109.06,-55.91) 3(0,-55.91) 4(109.06,-55.91) 5(218.11,-55.91) 6(-163.58,55.91) 7(-54.53,55.91) 8(54.53,55.91) 9(163.58,55.91)
  round 187.4 hole 128.35: 10(-491.93,0) 11(491.93,0)
Top Overlay:
  lines w7.87: -606.3,255.91 606.3,255.91 ; -376.38,374.21 ccw(c-376.38,401.57) -349.02,401.57 -349.02,582.68 ; -348.82,582.87 cw(c-321.46,582.87) -321.46,610.24 321.46,610.24 cw(c321.46,582.87) 348.82,582.87 ; -275.59,-114.17 -275.59,255.91 ; 275.59,-114.17 275.59,255.91 ; 349.02,582.68 349.02,401.57 ccw(c376.38,401.57) 376.38,374.21 ; -606.3,-114.17 -606.3,374.02 606.3,374.02 606.3,-114.17 -606.3,-114.17
  lines w8: -538,376.02 -538,401.02 ; -538,426.02 -538,526.02 ; -463,376.02 -463,401.02 ; -463,426.02 -463,526.02 ; 452,374.02 452,399.02 ; 452,424.02 452,524.02 ; 527,374.02 527,399.02 ; 527,424.02 527,524.02 ; -563,401.02 -438,401.02 -438,551.02 -563,551.02 -563,401.02 ; 427,399.02 552,399.02 552,549.02 427,549.02 427,399.02
  text "1" at -315,-75 h40
  text "5" at 305,-75 h40
  text "9" at 155,130 h40
  text "6" at -175,130 h40
  text "FMALE" at -150,285 h60
3D body "SW3dPS-9-PIN_DSUB-1.STEP": height 494.6, standoff -124.4, extent -604.5,-138 608.5,613

## CON-DSB 9-M [mil] "COM MALE D Subminiature; 9 Position; Right Angle; Pitch 1.385 mm"
height 501.97
pads (11):
  rect 65x90 hole 35: 1(-218.11,55.91)
  oval 65x90 hole 35: 2(-109.05,55.91) 3(0,55.91) 4(109.06,55.91) 5(218.11,55.91) 6(-163.58,-55.91) 7(-54.53,-55.91) 8(54.53,-55.91) 9(163.58,-55.91)
  round 187.4 hole 128.35: 10(491.93,0) 11(-491.93,0)
Top Overlay:
  lines w7.87: -606.3,-255.91 606.3,-255.91 ; -376.38,-374.21 cw(c-376.38,-401.57) -349.02,-401.57 -349.02,-582.68 ; -348.82,-582.87 ccw(c-321.46,-582.87) -321.46,-610.24 321.46,-610.24 ccw(c321.46,-582.87) 348.82,-582.87 ; -275.59,-255.91 -275.59,114.17 ; 275.59,-255.91 275.59,114.17 ; 349.02,-582.68 349.02,-401.57 cw(c376.38,-401.57) 376.38,-374.21 ; -606.3,-374.02 606.3,-374.02 606.3,114.17 -606.3,114.17 -606.3,-374.02
  lines w8: -527,-524.02 -527,-424.02 ; -527,-399.02 -527,-374.02 ; -452,-524.02 -452,-424.02 ; -452,-399.02 -452,-374.02 ; 463,-526.02 463,-426.02 ; 463,-401.02 463,-376.02 ; 538,-526.02 538,-426.02 ; 538,-401.02 538,-376.02 ; -552,-549.02 -427,-549.02 -427,-399.02 -552,-399.02 -552,-549.02 ; 438,-551.02 563,-551.02 563,-401.02 438,-401.02 438,-551.02
  text "6" at -155,-135 h40
  text "9" at 180,-125 h40
  text "5" at 330,75 h40
  text "1" at -305,70 h40
  text "MALE" at 130,-285 h60
3D body "SW3dPS-9-PIN_DSUB.STEP": height 494.6, standoff -124.4, extent -610,-637 606,138

## CON-DSB 9F-SM [mil] "Com 9 chan SMD,F"
pads (11):
  rect 60x100 smd: 1(0,0) 2(100,0) 3(200,0) 4(300,0) 5(400,0)
  rect 39.37x78.74 smd far side: 6(50,0) 7(150,0) 8(250,0) 9(350,0)
  round 1 all layers, no hole: 10(21,144) 11(152,144)
Top Overlay:
  lines w7: -125,65 -125,100 -125,200 525,200 525,65 510,50 435,50 -110,50 -120,60 -125,65
  text "1" at -10,70 h40
  text "5" at 390,70 h40
  text "SMD COM9" at -30,125 h60

## CON-DSB 9M-SM [mil] "Com 9 chan SMD,F"
pads (11):
  rect 60x100 smd: 1(0,0) 2(-100,0) 3(-200,0) 4(-300,0) 5(-400,0)
  rect 39.37x78.74 smd far side: 6(-50,0) 7(-150,0) 8(-250,0) 9(-350,0)
  round 1 all layers, no hole: 10(-379,144) 11(-248,144)
Top Overlay:
  lines w7: -525,65 -525,100 -525,200 125,200 125,65 110,50 35,50 -510,50 -520,60 -525,65
  text "1" at -4,67 h40
  text "5" at -415,72 h40
  text "SMD COM9" at -430,125 h60

## CON-DSB 15-F [mil] "COM FMALE - D Subminiature; 15 Position; Right Angle; Pitch 1.385 mm"
height 501.97
pads (17):
  rect 65x90 hole 35: 1(-381.69,-429.92)
  oval 65x90 hole 35: 2(-272.64,-429.92) 3(-163.58,-429.92) 4(-54.53,-429.92) 5(54.53,-429.92) 6(163.58,-429.92) 7(272.64,-429.92) 8(381.69,-429.92) 9(-327.17,-318.11) 10(-218.11,-318.11) 11(-109.06,-318.11) 12(0,-318.11) 13(109.06,-318.11) 14(218.11,-318.11) 15(327.17,-318.11)
  round 188.98 hole 125.2: 16(-655.91,-374.02) 17(655.91,-374.02)
Top Overlay:
  lines w7.87: -787.4,-118.11 787.4,-118.11 ; -519.49,0.2 ccw(c-519.49,27.56) -492.13,27.56 -492.13,208.66 ; -491.93,208.86 cw(c-464.57,208.86) -464.57,236.22 464.57,236.22 cw(c464.57,208.86) 491.93,208.86 ; -438.58,-492.13 -438.58,-118.11 ; 438.58,-492.13 438.58,-118.11 ; 492.13,208.66 492.13,27.56 ccw(c519.49,27.56) 519.49,0.2 ; -787.4,-492.13 787.4,-492.13 787.4,0 -787.4,0 -787.4,-492.13
  lines w8: -691,1 -691,26 ; -691,51 -691,151 ; -616,1 -616,26 ; -616,51 -616,151 ; 614,3 614,28 ; 614,53 614,153 ; 689,3 689,28 ; 689,53 689,153 ; -716,26 -591,26 -591,176 -716,176 -716,26 ; 589,28 714,28 714,178 589,178 589,28
  text "FMALE" at -140,-90 h60
  text "9" at -346.85,-195.87 h40
  text "15" at 282.87,-195.87 h40
  text "8" at 476,-469 h40
  text "1" at -488,-466 h40
3D body "SW3DPS-DB15RA_F-DEFAULT.STEP": height 494.7, standoff -137.19, extent -778.92,-485.41 780.92,239